# Altium footprint library RPSLib_orignal.PcbLib: 199 footprints (part 8 of 13)
Each footprint in its own frame and in the unit in brackets; x right, y up, seen from the top. Pads: shape width x height; smd on the part's side, far side on the other; paste and mask are expansions set on the pad; w line width, h text height; cw(c..) or ccw(c..) is an arc to the next point about the centre after c.
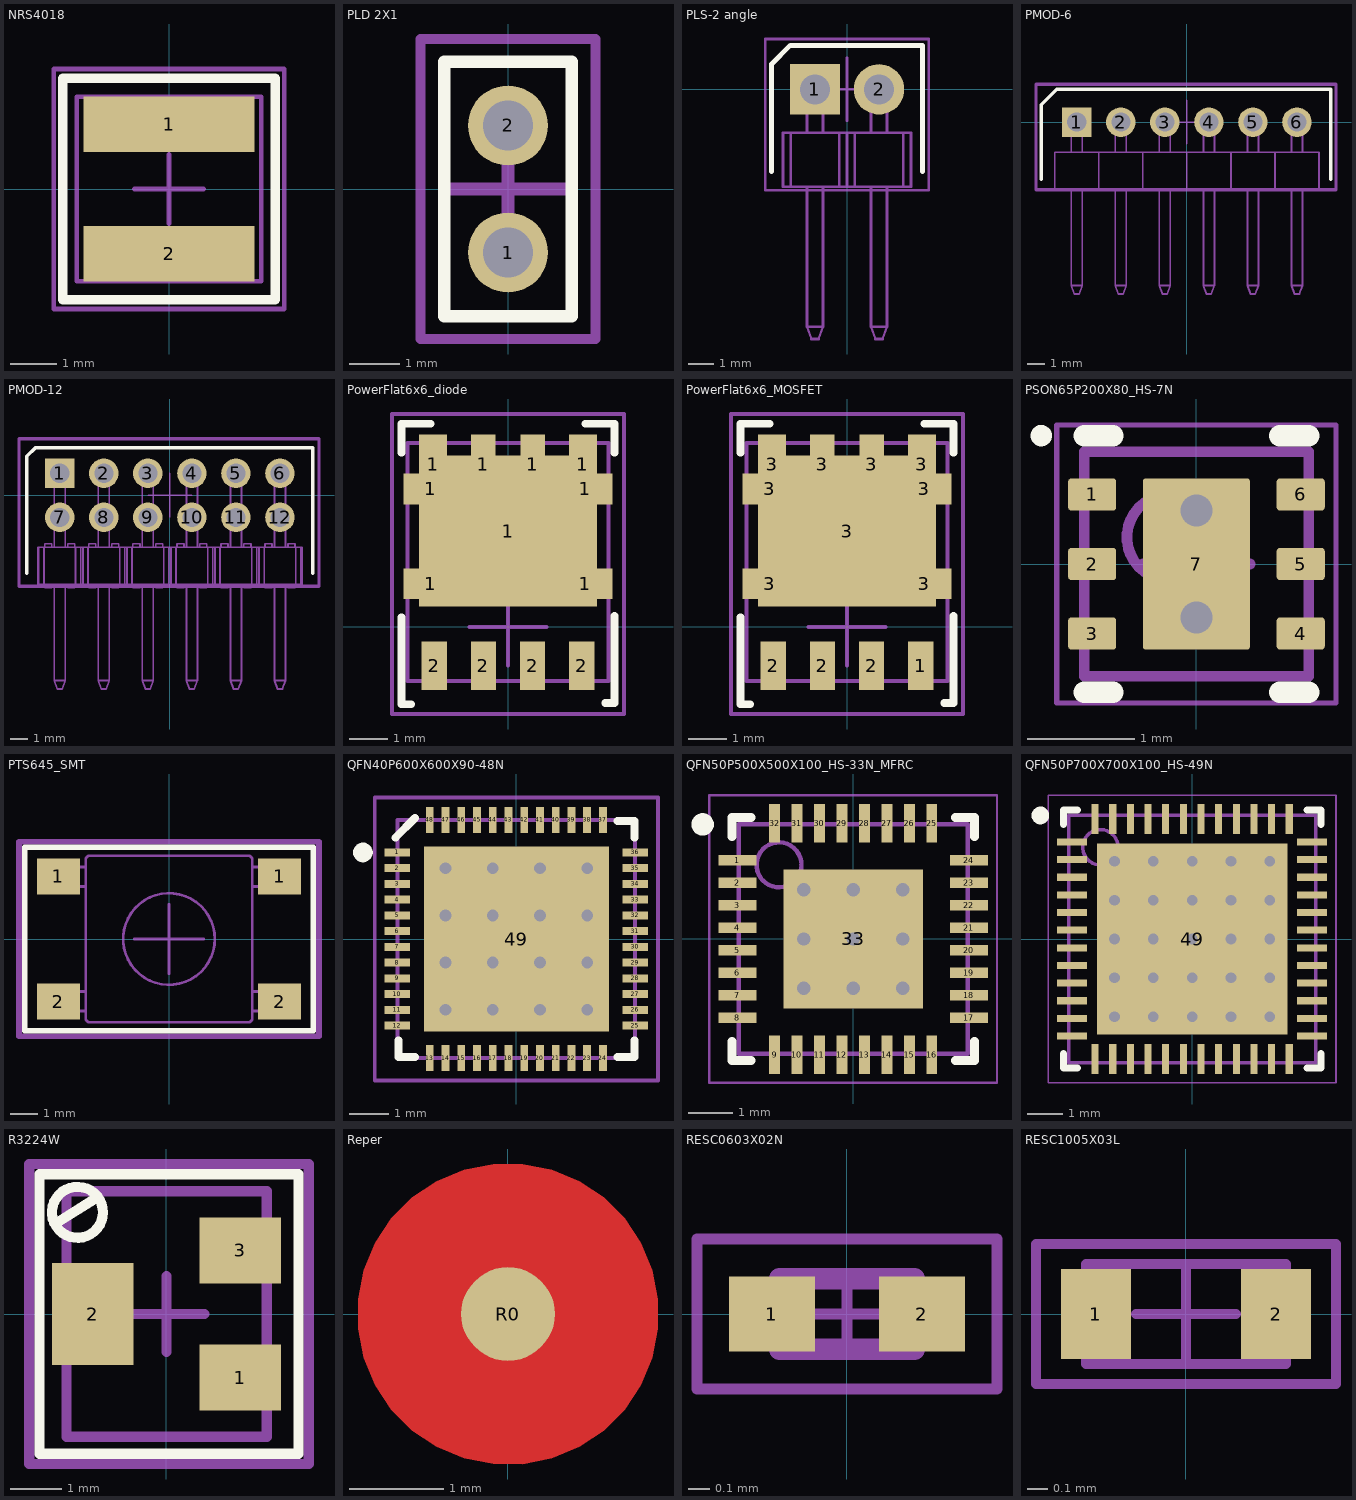
[diagram p7: the footprints below, top view; thin cyan lines are the x and y axes]

## NRS4018 [mm] "Fixed inductor 4.0x4.0x1.8 mm"
height 1.8
pads (2):
  rect 3.7x1.2 smd mask+0.07: 1(0,1.4) 2(0,-1.4)
Top Overlay:
  lines w0.2: -2.3,-2.4 2.3,-2.4 2.3,2.4 -2.3,2.4 -2.3,-2.4
Mechanical 13:
  lines w0.1: -2,-2 -2,2 2,2 2,-2 -2,-2
Mechanical 15:
  lines w0.1: -0.75,0 0.75,0 ; 0,-0.75 0,0.75 ; -2.5,-2.6 -2.5,2.6 2.5,2.6 2.5,-2.6 -2.5,-2.6
3D body "NRS4018.stp": height 1.8, standoff 0, extent -2,-2 2,2

## PLD 2X1 [mm]
pads (2):
  round 1.6 hole 1: 1(0,-1.27) 2(0,1.27)
Top Overlay:
  lines w0.25: -1.27,-2.54 -1.27,2.54 1.27,2.54 1.27,-2.54 -1.27,-2.54
Mechanical 13:
  lines w0.2: -1.27,-2.54 1.27,-2.54 1.27,2.54 -1.27,2.54 -1.27,-2.54
Mechanical 15:
  lines w0.2: -1.75,-3 1.75,-3 1.75,3 -1.75,3 -1.75,-3
  lines w0.254: -1.27,0 1.27,0 ; 0,-1.27 0,1.27
3D body "PLD-2.stp": height 8, standoff -3, extent -1.27,-2.54 1.27,2.54

## PLS-2 angle [mm] "Разъем PLS 2 контакта, угловой"
height 2.5
pads (2):
  rect 2x2 hole 1.2 unplated mask+0.07: 1(-1.27,0)
  round 2 hole 1.2 unplated mask+0.07: 2(1.27,0)
Top Overlay:
  lines w0.2: -3,-3.25 -3,1 -2.25,1.75 3,1.75 3,-3.25
Mechanical 13:
  lines w0.1: -1.587,-3.861 -1.587,-9.417 ; -1.587,-1.727 -1.587,-0.953 -1.587,0.318 -0.953,0.318 -0.953,-0.953 -0.953,-1.727 ; -0.953,-3.861 -0.953,-9.417 ; 0.953,-3.861 0.953,-9.417 ; 0.953,-1.727 0.953,-0.953 0.953,0.318 1.587,0.318 1.587,-0.953 1.587,-1.727 ; 1.587,-3.861 1.587,-9.417 ; -2.235,-3.861 -0.305,-3.861 ; -2.235,-3.861 -2.235,-1.727 ; -2.235,-3.861 -2.54,-3.861 -2.54,-1.727 -2.235,-1.727 ; -2.235,-1.727 -0.305,-1.727 ; -1.587,-9.417 -1.41,-9.906 -1.13,-9.906 -0.953,-9.417 ; -1.587,-9.417 -0.953,-9.417 ; -0.305,-3.861 0,-3.861 ; -0.305,-3.861 -0.305,-1.727 ; -0.305,-1.727 0,-1.727 ; 0,-3.861 0,-1.727 ; 0,-3.861 0.305,-3.861 ; 0,-1.727 0.305,-1.727 ; 0.305,-3.861 2.235,-3.861 ; 0.305,-3.861 0.305,-1.727 ; 0.305,-1.727 2.235,-1.727 ; 0.953,-9.417 1.13,-9.906 1.41,-9.906 1.587,-9.417 ; 0.953,-9.417 1.587,-9.417 ; 2.235,-3.861 2.235,-1.727 ; 2.235,-3.861 2.54,-3.861 2.54,-1.727 2.235,-1.727
Mechanical 15:
  lines w0.1: -1.25,0 1.25,0 ; 0,-1.25 0,1.25 ; -3.25,-4 3.25,-4 3.25,2 -3.25,2 -3.25,-4
3D body "PLS-2 pin angle.stp": height 2.41, standoff -2.98, extent -2.54,-9.906 2.54,0.318

## PMOD-6 [mm] "Digilent PMOD connector 6 pin"
height 2.5
pads (6):
  rect 1.7x1.7 hole 1.1 mask+0.07: 1(-6.35,0)
  round 1.7 hole 1.1 mask+0.07: 2(-3.81,0) 3(-1.27,0) 4(1.27,0) 5(3.81,0) 6(6.35,0)
Top Overlay:
  lines w0.2: -8.4,-3.3 -8.4,1 -7.5,1.9 8.3,1.9 8.3,-3.3
Mechanical 13:
  lines w0.1: -6.667,-3.861 -6.667,-9.417 ; -6.667,-1.727 -6.667,-0.953 -6.667,0.318 -6.032,0.318 -6.032,-0.953 -6.032,-1.727 ; -6.032,-3.861 -6.032,-9.417 ; -4.127,-3.861 -4.127,-9.417 ; -4.127,-1.727 -4.127,-0.953 -4.127,0.318 -3.492,0.318 -3.492,-0.953 -3.492,-1.727 ; -3.492,-3.861 -3.492,-9.417 ; -1.587,-3.861 -1.587,-9.417 ; -1.587,-1.727 -1.587,-0.953 -1.587,0.318 -0.953,0.318 -0.953,-0.953 -0.953,-1.727 ; -0.953,-3.861 -0.953,-9.417 ; 0.953,-3.861 0.953,-9.417 ; 0.953,-1.727 0.953,-0.953 0.953,0.318 1.587,0.318 1.587,-0.953 1.587,-1.727 ; 1.587,-3.861 1.587,-9.417 ; 3.492,-3.861 3.492,-9.417 ; 3.492,-1.727 3.492,-0.953 3.492,0.318 4.127,0.318 4.127,-0.953 4.127,-1.727 ; 4.127,-3.861 4.127,-9.417 ; 6.032,-3.861 6.032,-9.417 ; 6.032,-1.727 6.032,-0.953 6.032,0.318 6.667,0.318 6.667,-0.953 6.667,-1.727 ; 6.667,-3.861 6.667,-9.417 ; -6.667,-9.417 -6.49,-9.906 -6.21,-9.906 -6.032,-9.417 ; -6.667,-9.417 -6.032,-9.417 ; -5.08,-3.861 -5.385,-3.861 -7.315,-3.861 -7.62,-3.861 -7.62,-1.727 -7.315,-1.727 -5.385,-1.727 -5.08,-1.727 ; -5.08,-3.861 -4.775,-3.861 -2.845,-3.861 -2.54,-3.861 ; -5.08,-3.861 -5.08,-1.727 ; -5.08,-1.727 -4.775,-1.727 -2.845,-1.727 -2.54,-1.727 ; -4.127,-9.417 -3.492,-9.417 ; -4.127,-9.417 -3.95,-9.906 -3.67,-9.906 -3.492,-9.417 ; -2.54,-3.861 -2.235,-3.861 -0.305,-3.861 0,-3.861 ; -2.54,-3.861 -2.54,-1.727 ; -2.54,-1.727 -2.235,-1.727 -0.305,-1.727 0,-1.727 ; -1.587,-9.417 -1.41,-9.906 -1.13,-9.906 -0.953,-9.417 ; -1.587,-9.417 -0.953,-9.417 ; 0,-3.861 0.305,-3.861 2.235,-3.861 2.54,-3.861 ; 0,-3.861 0,-1.727 ; 0,-1.727 0.305,-1.727 2.235,-1.727 2.54,-1.727 ; 0.953,-9.417 1.13,-9.906 1.41,-9.906 1.587,-9.417 ; 0.953,-9.417 1.587,-9.417 ; 2.54,-3.861 2.845,-3.861 4.775,-3.861 5.08,-3.861 ; 2.54,-3.861 2.54,-1.727 ; 2.54,-1.727 2.845,-1.727 4.775,-1.727 5.08,-1.727 ; 3.492,-9.417 3.67,-9.906 3.95,-9.906 4.127,-9.417 ; 3.492,-9.417 4.127,-9.417 ; 5.08,-3.861 5.385,-3.861 7.315,-3.861 7.62,-3.861 7.62,-1.727 7.315,-1.727 5.385,-1.727 5.08,-1.727 ; 5.08,-3.861 5.08,-1.727 ; 6.032,-9.417 6.667,-9.417 ; 6.032,-9.417 6.21,-9.906 6.49,-9.906 6.667,-9.417
Mechanical 15:
  lines w0.1: -1.25,0 1.25,0 ; 0,-1.25 0,1.25
  lines w0.2: -8.7,-3.9 -8.7,2.2 8.6,2.2 8.6,-3.9 -8.7,-3.9
3D body "PMOD-6pin.stp": height 2.41, standoff -2.98, extent -7.62,-9.906 7.62,0.318

## PMOD-12 [mm] "Digilent PMOD connector 12 pin"
height 4.9
pads (12):
  rect 1.7x1.7 hole 1.1 mask+0.07: 1(-6.35,1.27)
  round 1.7 hole 1.1 mask+0.07: 2(-3.81,1.27) 3(-1.27,1.27) 4(1.27,1.27) 5(3.81,1.27) 6(6.35,1.27) 7(-6.35,-1.27) 8(-3.81,-1.27) 9(-1.27,-1.27) 10(1.27,-1.27) 11(3.81,-1.27) 12(6.35,-1.27)
Top Overlay:
  lines w0.2: -8.25,-4.5 -8.25,2.25 -7.75,2.75 8.25,2.75 8.25,-4.5
Mechanical 13:
  drawing of 256 lines, arcs and shapes, not listed
Mechanical 15:
  lines w0.1: -1.25,0 1.25,0 ; 0,-1.25 0,1.25
  lines w0.2: -8.7,-5.25 -8.7,3.25 8.6,3.25 8.6,-5.25 -8.7,-5.25
3D body "PMOD-12pin.stp": height 4.83, standoff -3.06, extent -7.62,-11.176 7.62,1.588

## PowerFlat6x6_diode [mm]
pads (13):
  rect 1.4x0.8 smd mask+0.07: 1(-2,1.115) 1(-2,3.565) 1(2,1.115) 1(2,3.565)
  rect 0.725x1.55 smd mask+0.07: 1(-1.937,4.2) 1(1.937,4.2)
  rect 0.625x1.55 smd mask+0.07: 1(-0.637,4.2) 1(0.637,4.2)
  rect 4.6x3.9 smd mask+0.07: 1(0,2.475)
  rect 0.65x1.25 smd mask+0.07: 2(-1.905,-1) 2(-0.635,-1) 2(0.635,-1) 2(1.905,-1)
Top Overlay:
  lines w0.2: -2.75,0.25 -2.75,-2 -2.5,-2 ; -2.75,4.5 -2.75,5.25 -2,5.25 ; 2,5.25 2.75,5.25 2.75,4.5 ; 2.512,-1.968 2.75,-1.968 2.75,0.282
Mechanical 13:
  lines w0.1: -2.6,-1.4 -2.6,4.75 2.6,4.75 2.6,-1.4 -2.6,-1.4
Mechanical 15:
  lines w0.1: -1,0 1,0 ; 0,-1 0,1 ; -3,-2.25 3,-2.25 3,5.5 -3,5.5 -3,-2.25
3D body "User Library-Power_Flat_5x6.step": height 0.95, standoff -0.04, extent -2.6,-1.4 2.6,4.75

## PowerFlat6x6_MOSFET [mm]
pads (13):
  rect 0.65x1.25 smd mask+0.07: 1(1.905,-1) 2(-1.905,-1) 2(-0.635,-1) 2(0.635,-1)
  rect 1.4x0.8 smd mask+0.07: 3(-2,1.115) 3(-2,3.565) 3(2,1.115) 3(2,3.565)
  rect 0.725x1.55 smd mask+0.07: 3(-1.937,4.2) 3(1.937,4.2)
  rect 0.625x1.55 smd mask+0.07: 3(-0.637,4.2) 3(0.637,4.2)
  rect 4.6x3.9 smd mask+0.07: 3(0,2.475)
Top Overlay:
  lines w0.2: -2.75,0.25 -2.75,-2 -2.5,-2 ; -2.75,4.5 -2.75,5.25 -2,5.25 ; 2,5.25 2.75,5.25 2.75,4.5 ; 2.512,-1.968 2.75,-1.968 2.75,0.282
Mechanical 13:
  lines w0.1: -2.6,-1.4 2.6,-1.4 2.6,4.75 -2.6,4.75 -2.6,-1.4
Mechanical 15:
  lines w0.1: -1,0 1,0 ; 0,-1 0,1 ; -3,-2.25 -3,5.5 3,5.5 3,-2.25 -3,-2.25
3D body "User Library-Power_Flat_5x6.step": height 0.95, standoff -0.04, extent -2.6,-1.4 2.6,4.75

## PSON65P200X80_HS-7N [mm] "PSON, 6-Leads, Body 2,00x2,00mm, Pitch 0,65mm, Thermal Pad 1,60x0,96mm, IPC Medium Density"
pads (7):
  rrect20% 0.45x0.3 smd paste-0.025 mask+0.07: 1(-0.975,0.65) 2(-0.975,0) 3(-0.975,-0.65) 4(0.975,-0.65) 5(0.975,0) 6(0.975,0.65)
  rrect5% 1x1.6 smd paste-1 mask+0.07: 7(0,0)
via 0,-0.5 diameter 0.5 hole 0.3
via 0,0.5 diameter 0.5 hole 0.3
Top Overlay:
  circle w0.1: c-1.45,1.2 r0.05
  lines w0.2: -1.05,-1.2 -0.78,-1.2 ; -1.05,1.2 -0.78,1.2 ; 0.78,-1.2 1.05,-1.2 ; 0.78,1.2 1.05,1.2
Top Paste:
  rectangle: -0.5,-0.8 0.5,-0.1
  rectangle: -0.5,0.1 0.5,0.8
Mechanical 13:
  circle w0.1: c-0.25,0.25 r0.4
  lines w0.1: -1.05,-1.05 1.05,-1.05 1.05,1.05 -1.05,1.05 -1.05,-1.05
Mechanical 15:
  lines w0.05: -1.305,-1.3 1.305,-1.3 1.305,1.3 -1.305,1.3 -1.305,-1.3
  lines w0.1: -0.5,0 0.5,0 ; 0,-0.5 0,0.5
3D body "PSON65P200X80_HS-7N.step": height 0.8, standoff 0, extent -1.051,-1.05 1.051,1.05

## PTS645_SMT [mm] "SMD tactile switch"
height 4.3
pads (4):
  rect 1.55x1.3 smd mask+0.07: 1(-3.98,2.25) 1(3.98,2.25) 2(-3.98,-2.25) 2(3.98,-2.25)
Top Overlay:
  lines w0.2: -5.2,-3.3 5.2,-3.3 5.2,3.3 -5.2,3.3 -5.2,-3.3
Mechanical 13:
  circle w0.1: c0,0 r1.65
  lines w0.1: -3,-2.592 -4.5,-2.592 -4.5,-1.892 -3,-1.892 ; -3,1.892 -4.5,1.892 -4.5,2.592 -3,2.592 ; 3,-2.592 4.5,-2.592 4.5,-1.892 3,-1.892 ; 3,1.892 4.5,1.892 4.5,2.592 3,2.592 ; -3,-2.85 ccw(c-2.85,-2.85) -2.85,-3 2.85,-3 ccw(c2.85,-2.85) 3,-2.85 3,2.85 ccw(c2.85,2.85) 2.85,3 -2.85,3 ccw(c-2.85,2.85) -3,2.85 -3,-2.85
Mechanical 15:
  lines w0.1: -1.25,0 1.25,0 ; 0,-1.25 0,1.25
  lines w0.2: -5.4,-3.5 5.4,-3.5 5.4,3.5 -5.4,3.5 -5.4,-3.5
3D body "User Library-PTS645SL43SMTR92-LFS.STEP": height 4.3, standoff 0, extent -4.5,-3 4.5,3

## QFN40P600X600X90-48N [mm] "QFN, 48-Leads, Body 6,0x6,0mm (max), Pitch 0,40mm, IPC Medium Density"
height 0.9
pads (49):
  rect 0.65x0.2 smd mask+0.07: 1(-3.025,2.2) 2(-3.025,1.8) 3(-3.025,1.4) 4(-3.025,1) 5(-3.025,0.6) 6(-3.025,0.2) 7(-3.025,-0.2) 8(-3.025,-0.6) 9(-3.025,-1) 10(-3.025,-1.4) 11(-3.025,-1.8) 12(-3.025,-2.2) 25(3.025,-2.2) 26(3.025,-1.8) 27(3.025,-1.4) 28(3.025,-1) 29(3.025,-0.6) 30(3.025,-0.2) 31(3.025,0.2) 32(3.025,0.6) 33(3.025,1) 34(3.025,1.4) 35(3.025,1.8) 36(3.025,2.2)
  rect 0.2x0.65 smd mask+0.07: 13(-2.2,-3.025) 14(-1.8,-3.025) 15(-1.4,-3.025) 16(-1,-3.025) 17(-0.6,-3.025) 18(-0.2,-3.025) 19(0.2,-3.025) 20(0.6,-3.025) 21(1,-3.025) 22(1.4,-3.025) 23(1.8,-3.025) 24(2.2,-3.025) 37(2.2,3.025) 38(1.8,3.025) 39(1.4,3.025) 40(1,3.025) 41(0.6,3.025) 42(0.2,3.025) 43(-0.2,3.025) 44(-0.6,3.025) 45(-1,3.025) 46(-1.4,3.025) 47(-1.8,3.025) 48(-2.2,3.025)
  rect 4.7x4.7 smd paste-3 mask+0.07: 49(0,0)
via -1.8,1.8 diameter 0.66 hole 0.3
via -0.6,1.8 diameter 0.66 hole 0.3
via 0.6,1.8 diameter 0.66 hole 0.3
via 1.8,1.8 diameter 0.66 hole 0.3
via -1.8,0.6 diameter 0.66 hole 0.3
via -0.6,0.6 diameter 0.66 hole 0.3
via 0.6,0.6 diameter 0.66 hole 0.3
via 1.8,0.6 diameter 0.66 hole 0.3
via -1.8,-0.6 diameter 0.66 hole 0.3
via -0.6,-0.6 diameter 0.66 hole 0.3
via 0.6,-0.6 diameter 0.66 hole 0.3
via 1.8,-0.6 diameter 0.66 hole 0.3
via -1.8,-1.8 diameter 0.66 hole 0.3
via -0.6,-1.8 diameter 0.66 hole 0.3
via 0.6,-1.8 diameter 0.66 hole 0.3
via 1.8,-1.8 diameter 0.66 hole 0.3
Top Overlay:
  circle w0.25: c-3.9,2.2 r0.125
  lines w0.2: -3.075,2.575 -2.575,3.075 ; -3,-2.575 -3,-3 -2.575,-3 ; 2.575,-3 3,-3 3,-2.575 ; 2.575,3 3,3 3,2.575
Top Paste:
  region: -2.117,0.117 -0.117,0.117 -0.117,2.117 -2.117,2.117
  region: 0.117,0.117 2.117,0.117 2.117,2.117 0.117,2.117
  region: 0.117,-2.117 2.117,-2.117 2.117,-0.117 0.117,-0.117
  region: -2.117,-2.117 -0.117,-2.117 -0.117,-0.117 -2.117,-0.117
Mechanical 13:
  lines w0.1: -3.02,-3.02 3.02,-3.02 3.02,3.02 -3.02,3.02 -3.02,-3.02
Mechanical 15:
  lines w0.1: -0.5,0 0.5,0 ; 0,-0.5 0,0.5 ; -3.6,-3.6 -3.6,3.6 3.6,3.6 3.6,-3.6 -3.6,-3.6
3D body "User Library-QFN48.step": height 0.86, standoff -0.01, extent -3.02,-3.02 3.02,3.02

## QFN50P500X500X100_HS-33N_MFRC [mm] "QFN, 32-Leads, Body 5,00x5,00mm, Pitch 0,50mm, Thermal Pad 3,10x3,10mm, IPC Medium Density"
height 1
pads (33):
  rect 0.85x0.24 smd mask+0.07: 1(-2.575,1.75) 2(-2.575,1.25) 3(-2.575,0.75) 4(-2.575,0.25) 5(-2.575,-0.25) 6(-2.575,-0.75) 7(-2.575,-1.25) 8(-2.575,-1.75) 17(2.575,-1.75) 18(2.575,-1.25) 19(2.575,-0.75) 20(2.575,-0.25) 21(2.575,0.25) 22(2.575,0.75) 23(2.575,1.25) 24(2.575,1.75)
  rect 0.24x0.85 smd mask+0.07: 9(-1.75,-2.575) 10(-1.25,-2.575) 11(-0.75,-2.575) 12(-0.25,-2.575) 13(0.25,-2.575) 14(0.75,-2.575) 15(1.25,-2.575) 16(1.75,-2.575) 25(1.75,2.575) 26(1.25,2.575) 27(0.75,2.575) 28(0.25,2.575) 29(-0.25,2.575) 30(-0.75,2.575) 31(-1.25,2.575) 32(-1.75,2.575)
  rect 3.1x3.1 smd paste-2: 33(0,0)
via -1.1,1.1 diameter 0.5 hole 0.3
via 0,1.1 diameter 0.5 hole 0.3
via 1.1,1.1 diameter 0.5 hole 0.3
via -1.1,0 diameter 0.5 hole 0.3
via 0,0 diameter 0.5 hole 0.3
via 1.1,0 diameter 0.5 hole 0.3
via -1.1,-1.1 diameter 0.5 hole 0.3
via 0,-1.1 diameter 0.5 hole 0.3
via 1.1,-1.1 diameter 0.5 hole 0.3
Top Overlay:
  circle w0.25: c-3.35,2.55 r0.125
  lines w0.2: -2.7,-2.275 -2.7,-2.7 -2.275,-2.7 ; -2.7,2.275 -2.7,2.7 -2.275,2.7 ; 2.275,-2.7 2.7,-2.7 2.7,-2.275 ; 2.275,2.7 2.7,2.7 2.7,2.275
Top Paste:
  region: -1.35,-1.35 -1.35,-0.1 -0.1,-0.1 -0.1,-1.35
  region: 0.1,-1.35 0.1,-0.1 1.35,-0.1 1.35,-1.35
  region: 0.1,0.1 0.1,1.35 1.35,1.35 1.35,0.1
  region: -1.35,0.1 -1.35,1.35 -0.1,1.35 -0.1,0.1
Mechanical 13:
  circle w0.1: c-1.65,1.65 r0.5
  lines w0.1: -2.55,-2.55 -2.55,2.55 2.55,2.55 2.55,-2.55 -2.55,-2.55
Mechanical 15:
  lines w0.05: -3.2,-3.2 -3.2,3.2 3.2,3.2 3.2,-3.2 -3.2,-3.2
  lines w0.1: -0.5,0 0.5,0 ; 0,-0.5 0,0.5
3D body "QFN50P500X500X100_HS-33N.step": height 1, standoff 0, extent -2.56,-2.56 2.56,2.56

## QFN50P700X700X100_HS-49N [mm] "QFN, 48-Leads, Body 7,00x7,00mm, Pitch 0,50mm, Thermal Pad 5,40x5,40mm, IPC Medium Density"
height 1
pads (49):
  rect 0.85x0.2 smd mask+0.07: 1(-3.4,2.75) 2(-3.4,2.25) 3(-3.4,1.75) 4(-3.4,1.25) 5(-3.4,0.75) 6(-3.4,0.25) 7(-3.4,-0.25) 8(-3.4,-0.75) 9(-3.4,-1.25) 10(-3.4,-1.75) 11(-3.4,-2.25) 12(-3.4,-2.75) 25(3.4,-2.75) 26(3.4,-2.25) 27(3.4,-1.75) 28(3.4,-1.25) 29(3.4,-0.75) 30(3.4,-0.25) 31(3.4,0.25) 32(3.4,0.75) 33(3.4,1.25) 34(3.4,1.75) 35(3.4,2.25) 36(3.4,2.75)
  rect 0.2x0.85 smd mask+0.07: 13(-2.75,-3.4) 14(-2.25,-3.4) 15(-1.75,-3.4) 16(-1.25,-3.4) 17(-0.75,-3.4) 18(-0.25,-3.4) 19(0.25,-3.4) 20(0.75,-3.4) 21(1.25,-3.4) 22(1.75,-3.4) 23(2.25,-3.4) 24(2.75,-3.4) 37(2.75,3.4) 38(2.25,3.4) 39(1.75,3.4) 40(1.25,3.4) 41(0.75,3.4) 42(0.25,3.4) 43(-0.25,3.4) 44(-0.75,3.4) 45(-1.25,3.4) 46(-1.75,3.4) 47(-2.25,3.4) 48(-2.75,3.4)
  rect 5.4x5.4 smd paste-3 mask+0.07: 49(0,0)
via -2.2,2.2 diameter 0.6 hole 0.3
via -1.1,2.2 diameter 0.6 hole 0.3
via 0,2.2 diameter 0.6 hole 0.3
via 1.1,2.2 diameter 0.6 hole 0.3
via 2.2,2.2 diameter 0.6 hole 0.3
via -2.2,1.1 diameter 0.6 hole 0.3
via -1.1,1.1 diameter 0.6 hole 0.3
via 0,1.1 diameter 0.6 hole 0.3
via 1.1,1.1 diameter 0.6 hole 0.3
via 2.2,1.1 diameter 0.6 hole 0.3
via -2.2,0 diameter 0.6 hole 0.3
via -1.1,0 diameter 0.6 hole 0.3
via 0,0 diameter 0.6 hole 0.3
via 1.1,0 diameter 0.6 hole 0.3
via 2.2,0 diameter 0.6 hole 0.3
via -2.2,-1.1 diameter 0.6 hole 0.3
via -1.1,-1.1 diameter 0.6 hole 0.3
via 0,-1.1 diameter 0.6 hole 0.3
via 1.1,-1.1 diameter 0.6 hole 0.3
via 2.2,-1.1 diameter 0.6 hole 0.3
via -2.2,-2.2 diameter 0.6 hole 0.3
via -1.1,-2.2 diameter 0.6 hole 0.3
via 0,-2.2 diameter 0.6 hole 0.3
via 1.1,-2.2 diameter 0.6 hole 0.3
via 2.2,-2.2 diameter 0.6 hole 0.3
Top Overlay:
  circle w0.25: c-4.3,3.5 r0.125
  lines w0.2: -3.65,-3.25 -3.65,-3.65 -3.25,-3.65 ; -3.65,3.25 -3.65,3.65 -3.25,3.65 ; 3.25,-3.65 3.65,-3.65 3.65,-3.25 ; 3.25,3.65 3.65,3.65 3.65,3.25
Top Paste:
  region: -2.3,0.2 -0.2,0.2 -0.2,2.3 -2.3,2.3
  region: 0.2,0.2 2.3,0.2 2.3,2.3 0.2,2.3
  region: 0.2,-2.3 2.3,-2.3 2.3,-0.2 0.2,-0.2
  region: -2.3,-2.3 -0.2,-2.3 -0.2,-0.2 -2.3,-0.2
Mechanical 13:
  circle w0.1: c-2.6,2.6 r0.5
  lines w0.1: -3.5,-3.5 -3.5,3.5 3.5,3.5 3.5,-3.5 -3.5,-3.5
Mechanical 15:
  lines w0.05: -4.075,-4.075 -4.075,4.075 4.075,4.075 4.075,-4.075 -4.075,-4.075
  lines w0.1: -0.5,0 0.5,0 ; 0,-0.5 0,0.5
3D body "QFN50P700X700X100_HS-49N.step": height 1, standoff 0, extent -3.51,-3.51 3.51,3.51

## R3224W [mm] "Подстроечный резистор"
height 5.3
pads (3):
  rect 1.6x1.3 smd mask+0.07: 1(1.45,-1.25) 3(1.45,1.25)
  rect 1.6x2 smd mask+0.07: 2(-1.45,0)
Top Overlay:
  circle w0.2: c-1.75,2 r0.501
  lines w0.2: -2.189,1.773 -1.35,2.3 ; -2.5,-2.75 2.6,-2.75 2.6,2.75 -2.5,2.75 -2.5,-2.75
Mechanical 13:
  lines w0.2: -1.965,-2.413 -1.965,2.413 1.973,2.413 1.973,-2.413 -1.965,-2.413
Mechanical 15:
  lines w0.2: -0.75,0 0.75,0 ; 0,-0.75 0,0.75 ; -2.7,-2.95 2.8,-2.95 2.8,2.95 -2.7,2.95 -2.7,-2.95
3D body "Bourns-3224w-1-104e.stp": height 5.28, standoff 0, extent -1.965,-2.413 1.973,2.413

## Reper [mm] "Опорная точка"
height 0.1
pads (1):
  round 1 smd paste-2 mask+1: R0(0,0)
Top Layer:
  pour cut-out: 0,-1.6 -0.158,-1.6 -0.467,-1.538 -0.758,-1.418 -1.02,-1.243 -1.243,-1.02 -1.418,-0.758 -1.538,-0.467 -1.6,-0.158 -1.6,0 -1.6,0.158 -1.538,0.467 -1.418,0.758 -1.243,1.02 -1.02,1.243 -0.758,1.418 -0.467,1.539 -0.158,1.6 0,1.6 0.158,1.6 0.467,1.539 0.758,1.418 1.02,1.243 1.243,1.02 1.418,0.758 1.539,0.467 1.6,0.158 1.6,0 1.6,-0.158 1.539,-0.467 1.418,-0.758 1.243,-1.02 1.02,-1.243 0.758,-1.418 0.467,-1.538 0.158,-1.6

## RESC0603X02N [mm] "Chip Resistor, 2-Leads, Body 0.60x0.30mm, IPC Medium Density"
height 0.23
pads (2):
  rect 0.4x0.35 smd paste-1: 1(-0.35,0) 2(0.35,0)
Top Paste:
  region: 0.45,0.15 0.46,0.15 0.478,0.142 0.492,0.128 0.5,0.11 0.5,0.1 0.5,-0.1 0.5,-0.11 0.492,-0.128 0.478,-0.142 0.46,-0.15 0.45,-0.15 0.225,-0.15 0.215,-0.15 0.197,-0.142 0.183,-0.128 0.175,-0.11 0.175,-0.1 0.175,0.1 0.175,0.11 0.183,0.128 0.197,0.142 0.215,0.15 0.225,0.15
  region: -0.45,-0.15 -0.46,-0.15 -0.478,-0.142 -0.492,-0.128 -0.5,-0.11 -0.5,-0.1 -0.5,0.1 -0.5,0.11 -0.492,0.128 -0.478,0.142 -0.46,0.15 -0.45,0.15 -0.225,0.15 -0.215,0.15 -0.197,0.142 -0.183,0.128 -0.175,0.11 -0.175,0.1 -0.175,-0.1 -0.175,-0.11 -0.183,-0.128 -0.197,-0.142 -0.215,-0.15 -0.225,-0.15
Mechanical 13:
  lines w0.1: -0.315,-0.165 0.315,-0.165 0.315,0.165 -0.315,0.165 -0.315,-0.165
Mechanical 15:
  lines w0.05: -0.165,0 0.165,0 ; 0,-0.165 0,0.165 ; -0.7,-0.35 0.7,-0.35 0.7,0.35 -0.7,0.35 -0.7,-0.35
3D body "RESC0603X02N.step": height 0.23, standoff 0, extent -0.315,-0.165 0.315,0.165

## RESC1005X03L [mm] "Chip Resistor, 2-Leads, Body 1.00x0.50mm, IPC High Density"
height 0.35
pads (2):
  rect 0.35x0.45 smd mask+0.07: 1(-0.45,0) 2(0.45,0)
Mechanical 13:
  lines w0.05: -0.5,-0.25 -0.5,0.25 0.5,0.25 0.5,-0.25 -0.5,-0.25
Mechanical 15:
  lines w0.05: -0.25,0 0.25,0 ; 0,-0.25 0,0.25 ; -0.75,-0.35 -0.75,0.35 0.75,0.35 0.75,-0.35 -0.75,-0.35
3D body "RESC1005X03L.step": height 0.35, standoff 0, extent -0.5,-0.25 0.5,0.25